# Altium footprint library Connectors.PcbLib: 68 footprints (part 1 of 5)
Each footprint in its own frame and in the unit in brackets; x right, y up, seen from the top. Pads: shape width x height; smd on the part's side, far side on the other; paste and mask are expansions set on the pad; w line width, h text height; cw(c..) or ccw(c..) is an arc to the next point about the centre after c.
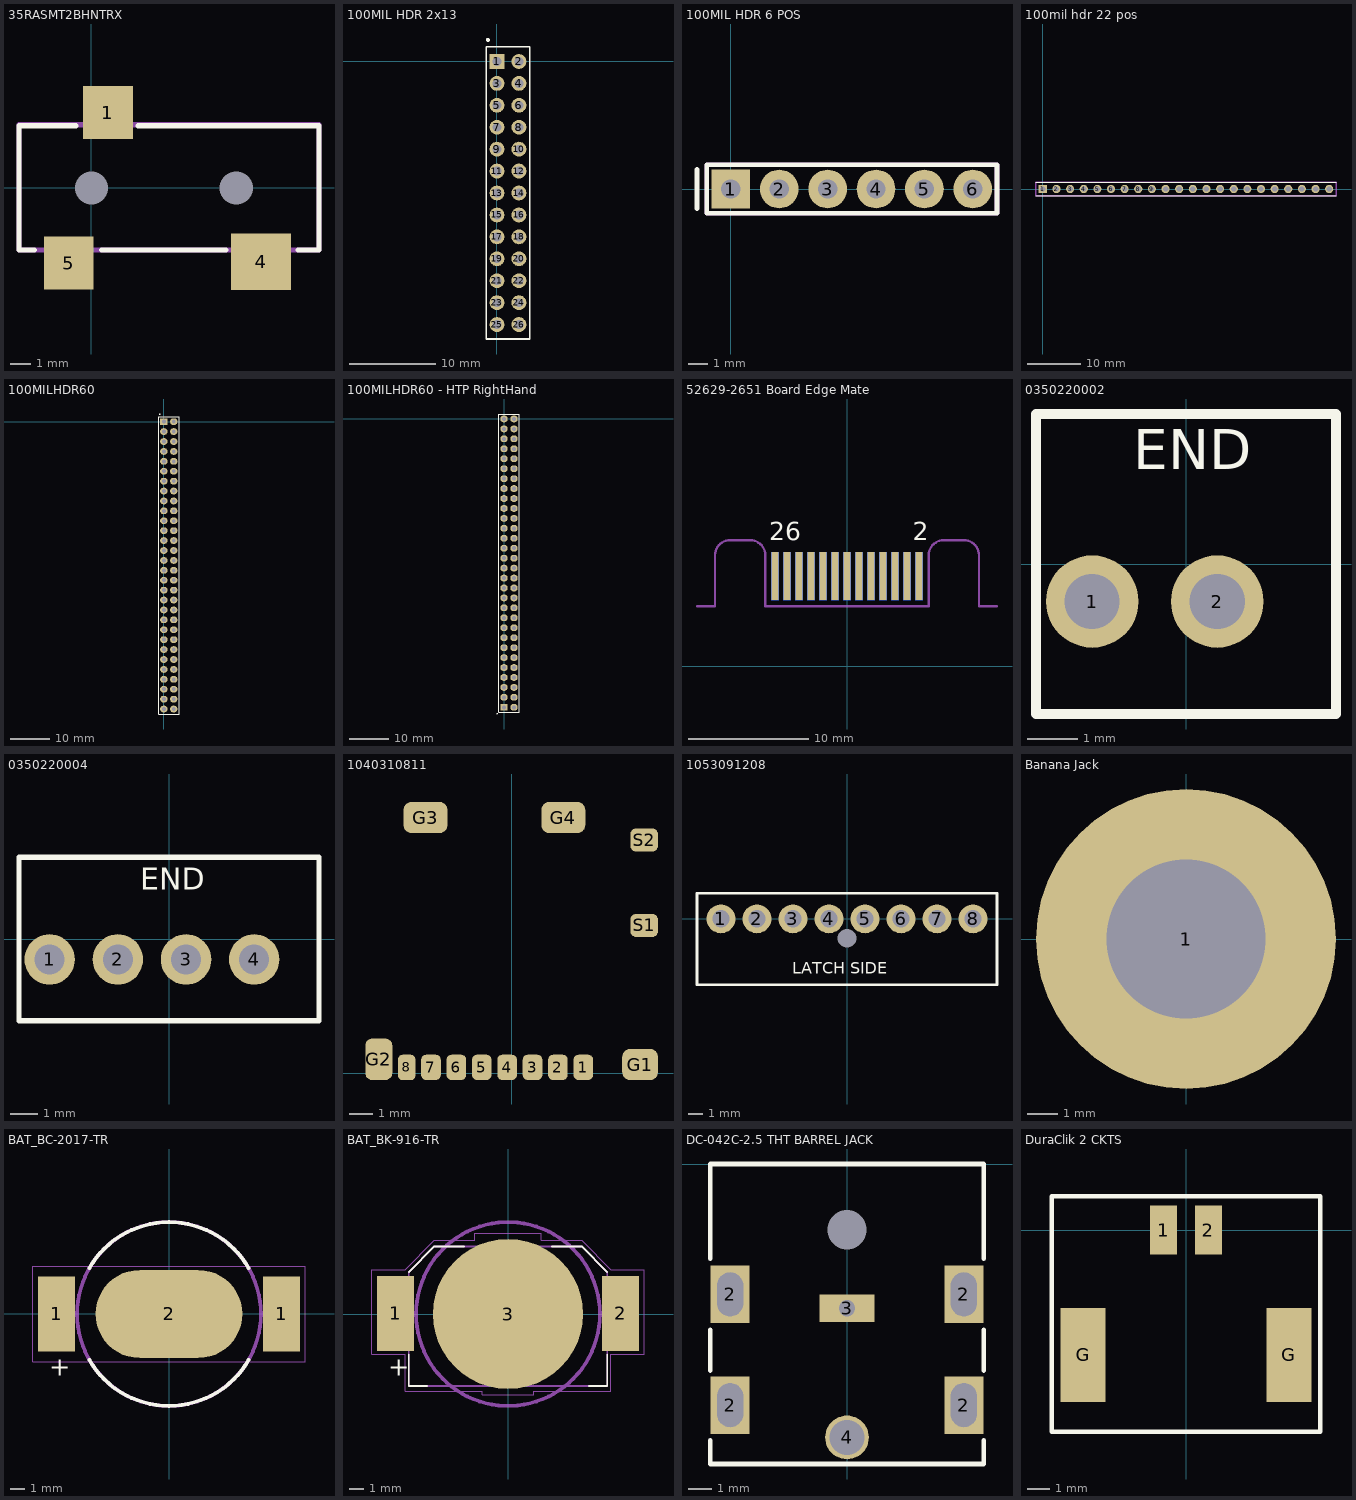
[diagram p0: the footprints below, top view; thin cyan lines are the x and y axes]

## 35RASMT2BHNTRX [mm]
pads (5):
  rect 2.4x2.55 smd: 1(0.8,3.638) 5(-1.1,-3.638)
  rect 2.9x2.75 smd: 4(8.2,-3.575)
  round 0 hole 1.6 unplated: M(0,0) M(7,0)
Top Overlay:
  lines w0.254: -2.75,-3 -3.5,-3 -3.5,3 -1,3 -0.75,3 ; 0.5,-3 6.5,-3 ; 2.25,3 11,3 11,-3 10,-3
Top Assy Drawing:
  lines w0.254: -3.5,-3 11,-3 11,3.048 -3.5,3.048 -3.5,-3
  text ".Designator" at -2.54,-1.27 h1.27
3D body "35RASMT2BHNTRX-TRS Connector v3.step": height 5.02, standoff -0.98, extent -5.982,-4.496 11.011,4.496

## 100MIL HDR 2x13 [mm]
pads (26):
  rect 1.72x1.72 hole 1.02: 1(0,0)
  round 1.72 hole 1.02: 2(2.54,0) 3(0,-2.54) 4(2.54,-2.54) 5(0,-5.08) 6(2.54,-5.08) 7(0,-7.62) 8(2.54,-7.62) 9(0,-10.16) 10(2.54,-10.16) 11(0,-12.7) 12(2.54,-12.7) 13(0,-15.24) 14(2.54,-15.24) 15(0,-17.78) 16(2.54,-17.78) 17(0,-20.32) 18(2.54,-20.32) 19(0,-22.86) 20(2.54,-22.86) 21(0,-25.4) 22(2.54,-25.4) 23(0,-27.94) 24(2.54,-27.94) 25(0,-30.48) 26(2.54,-30.48)
Top Overlay:
  circle w0.254: c-1.05,2.5 r0.1
  lines w0.2: -1.25,-32.15 3.8,-32.15 3.8,0 3.8,1.7 -1.25,1.7 -1.25,0.25 -1.25,-32.15

## 100MIL HDR 6 POS [mil]
pads (6):
  rect 80x80 hole 40: 1(0,0)
  round 80 hole 40: 2(100,0) 3(200,0) 4(300,0) 5(400,0) 6(500,0)
Top Overlay:
  lines w10: -70,-40 -70,40 ; -50,-50 -50,50 550,50 550,-50 -50,-50
Top Assy Drawing:
  lines w10: -50,-50 -50,50 550,50 550,-50 -50,-50
3D body "c-3-644456-6-j-3d.stp": height 395, standoff -110, extent -44.09,-45.99 544.1,46.01

## 100mil hdr 22 pos [mil]
pads (22):
  rect 60x60 hole 40: 1(0,0)
  round 60 hole 40: 2(100,0) 3(200,0) 4(300,0) 5(400,0) 6(500,0) 7(600,0) 8(700,0) 9(800,0) 10(900,0) 11(1000,0) 12(1100,0) 13(1200,0) 14(1300,0) 15(1400,0) 16(1500,0) 17(1600,0) 18(1700,0) 19(1800,0) 20(1900,0) 21(2000,0) 22(2100,0)
Top Overlay:
  lines w7.87: -50,-50 2150,-50 ; -50,50 2150,50
Top Assy Drawing:
  lines w10: -50,-50 -50,50 2150,50 2150,-50 -50,-50
  text ".Designator" at 740,-60 h50
3D body "022284220.stp": height 330, standoff -125, extent -49.99,-45 2150.01,53

## 100MILHDR60 [mm]
pads (60):
  rect 1.9x1.72 hole 1.02: 1(0,0)
  oval 1.9x1.72 hole 1.02: 2(2.54,0) 3(0,-2.54) 4(2.54,-2.54) 5(0,-5.08) 6(2.54,-5.08) 7(0,-7.62) 8(2.54,-7.62) 9(0,-10.16) 10(2.54,-10.16) 11(0,-12.7) 12(2.54,-12.7) 13(0,-15.24) 14(2.54,-15.24) 15(0,-17.78) 16(2.54,-17.78) 17(0,-20.32) 18(2.54,-20.32) 19(0,-22.86) 20(2.54,-22.86) 21(0,-25.4) 22(2.54,-25.4) 23(0,-27.94) 24(2.54,-27.94) 25(0,-30.48) 26(2.54,-30.48) 27(0,-33.02) 28(2.54,-33.02) 29(0,-35.56) 30(2.54,-35.56) 31(0,-38.1) 32(2.54,-38.1) 33(0,-40.64) 34(2.54,-40.64) 35(0,-43.18) 36(2.54,-43.18) 37(0,-45.72) 38(2.54,-45.72) 39(0,-48.26) 40(2.54,-48.26) 41(0,-50.8) 42(2.54,-50.8) 43(0,-53.34) 44(2.54,-53.34) 45(0,-55.88) 46(2.54,-55.88) 47(0,-58.42) 48(2.54,-58.42) 49(0,-60.96) 50(2.54,-60.96) 51(0,-63.5) 52(2.54,-63.5) 53(0,-66.04) 54(2.54,-66.04) 55(0,-68.58) 56(2.54,-68.58) 57(0,-71.12) 58(2.54,-71.12) 59(0,-73.66) 60(2.54,-73.66)
Top Overlay:
  circle w0.254: c-1.05,1.9 r0.071
  lines w0.2: -1.3,-74.93 3.95,-74.93 3.95,1.27 -1.3,1.27 -1.3,-74.93

## 100MILHDR60 - HTP RightHand [mm] "60-pin connector for mounting on right hand side of HTP. Mates correctly with OBC (top connector). Assume right-angle connector style."
pads (60):
  rect 1.72x1.72 hole 1.02: 1(0,-73.66)
  oval 1.9x1.72 hole 1.02: 2(2.54,-73.66) 3(0,-71.12) 4(2.54,-71.12) 5(0,-68.58) 6(2.54,-68.58) 7(0,-66.04) 8(2.54,-66.04) 9(0,-63.5) 10(2.54,-63.5) 11(0,-60.96) 12(2.54,-60.96) 13(0,-58.42) 14(2.54,-58.42) 15(0,-55.88) 16(2.54,-55.88) 17(0,-53.34) 18(2.54,-53.34) 19(0,-50.8) 20(2.54,-50.8) 21(0,-48.26) 22(2.54,-48.26) 23(0,-45.72) 24(2.54,-45.72) 25(0,-43.18) 26(2.54,-43.18) 27(0,-40.64) 28(2.54,-40.64) 29(0,-38.1) 30(2.54,-38.1) 31(0,-35.56) 32(2.54,-35.56) 33(0,-33.02) 34(2.54,-33.02) 35(0,-30.48) 36(2.54,-30.48) 37(0,-27.94) 38(2.54,-27.94) 39(0,-25.4) 40(2.54,-25.4) 41(0,-22.86) 42(2.54,-22.86) 43(0,-20.32) 44(2.54,-20.32) 45(0,-17.78) 46(2.54,-17.78) 47(0,-15.24) 48(2.54,-15.24) 49(0,-12.7) 50(2.54,-12.7) 51(0,-10.16) 52(2.54,-10.16) 53(0,-7.62) 54(2.54,-7.62) 55(0,-5.08) 56(2.54,-5.08) 57(0,-2.54) 58(2.54,-2.54) 59(0,0) 60(2.54,0)
Top Overlay:
  circle w0.254: c-1.75,-75.3 r0.071
  lines w0.2: -1.35,-74.93 -1.35,1.27 3.85,1.27 3.85,-74.93 -1.35,-74.93

## 52629-2651 Board Edge Mate [mm] "Board Edge Mate for Molex 52629-2651"
pads (26):
  rect 0.6x4 smd far side: 1(6,7.5) 3(5,7.5) 5(4,7.5) 7(3,7.5) 9(2,7.5) 11(1,7.5) 13(0,7.5) 15(-1,7.5) 17(-2,7.5) 19(-3,7.5) 21(-4,7.5) 23(-5,7.5) 25(-6,7.5)
  rect 0.6x4 smd: 2(6,7.5) 4(5,7.5) 6(4,7.5) 8(3,7.5) 10(2,7.5) 12(1,7.5) 14(0,7.5) 16(-1,7.5) 18(-2,7.5) 20(-3,7.5) 22(-4,7.5) 24(-5,7.5) 26(-6,7.5)
Top Overlay:
  text "26" at -6.5,10.5 h1.52
  text "2" at 5.5,10.5 h1.52
Bottom Overlay:
  text "25" at -4,10.5 h1.52
  text "1" at 6,10.5 h1.52
Top Dimensions and Assy Info:
  lines w0.2: -12.5,5 -11,5 -11,8.5 -11,9.23 cw(c-9.73,9.23) -9.73,10.5 -8.73,10.5 -8.07,10.5 cw(c-8.07,9.23) -6.8,9.23 -6.8,9 -6.8,5 -6.3,5 6.3,5 6.4,5 6.8,5 6.8,9 6.8,9.23 cw(c8.07,9.23) 8.07,10.5 9.5,10.5 9.73,10.5 cw(c9.73,9.23) 11,9.23 11,8 11,5 12.5,5
  text "Board thickness must be 1.0 mm" at -14.5,13.5 h1
3D body "526292651.stp": height 2.5, standoff -3.65, extent -15,-2.85 15,10.15

## 0350220002 [mm] "CONN PLUG 4POS 2.5MM R/A"
height 3
pads (2):
  round 1.85 hole 1.1: 1(-1.875,-0.75) 2(0.625,-0.75)
Top Overlay:
  lines w0.2: -3,-3 -3,3 3,3 3,-3 -3,-3
  text "END" at -1.05,1.9 h0.8
3D body "350220002.stp": height 2.98, standoff 0.02, extent -3,-2.95 3,2.95

## 0350220004 [mm] "CONN PLUG 4POS 2.5MM R/A"
height 3
pads (4):
  round 1.85 hole 1.1: 1(-4.375,-0.75) 2(-1.875,-0.75) 3(0.625,-0.75) 4(3.125,-0.75)
Top Overlay:
  lines w0.2: -5.5,-3 -5.5,3 5.5,3 5.5,-3 -5.5,-3
  text "END" at -1.05,1.8 h0.8
3D body "350220004.stp": height 2.98, standoff 0.02, extent -5.5,-2.95 5.5,2.95

## 1040310811 [mm] "CONN MICRO SD CARD PUSH-PULL R/A"
height 1.5
pads (14):
  rrect50% 0.85x1.1 smd: 1(3.105,0.25) 2(2.005,0.25) 3(0.905,0.25) 4(-0.195,0.25) 5(-1.295,0.25) 6(-2.395,0.25) 7(-3.495,0.25)
  rrect50% 0.75x1.1 smd: 8(-4.545,0.25)
  rrect50% 1.55x1.35 smd: G1(5.565,0.375)
  rrect50% 1.17x1.8 smd: G2(-5.755,0.6)
  rrect50% 1.9x1.35 smd: G3(-3.73,11.075) G4(2.24,11.075)
  rrect50% 1.2x1 smd: S1(5.74,6.4) S2(5.74,10.1)
3D body "1040310811 Micro SD Slot v8.step": height 1.46, standoff 0.01, extent -5.95,0.1 6,11.5

## 1053091208 [mm] "NANO-FIT HDR VT SGL KNK 8CKT 15A"
height 10.51
pads (9):
  round 2 hole 1.2: 1(-8.75,0) 2(-6.25,0) 3(-3.75,0) 4(-1.25,0) 5(1.25,0) 6(3.75,0) 7(6.25,0) 8(8.75,0)
  round 0 hole 1.3: 9(0,-1.34)
Top Overlay:
  lines w0.2: -10.414,-4.572 -10.414,-1.27 -10.414,1.778 10.414,1.778 10.414,-1.27 10.414,-4.572 -10.414,-4.572
  text "LATCH SIDE" at -3.81,-3.81 h0.8
3D body "1053091208.stp": height 10.68, standoff -3.03, extent -10.47,-4.6 10.47,1.74

## Banana Jack [mm] "JACK NON-INSULATED .350\""
height 2.36
pads (1):
  round 10 hole 5.3: 1(0,0)
3D body "Keystone-PN575-4 Banana Swage v4.step": height 2.37, standoff -5.52, extent -3.962,-3.959 3.962,3.959

## BAT_BC-2017-TR [mm]
pads (3):
  rect 2.5x5.1 smd: 1(-7.65,0) 1(7.65,0)
  oval 10x6 smd: 2(0,0)
Top Overlay:
  lines w0.254: -5.413,-3.125 ccw(c0,0) 5.412,-3.125 ; -5.413,3.125 cw(c0,0) 5.413,3.125
  text "+" at -8.128,-4.191 h1.27
Top Dimensions and Assy Info:
  circle w0.254: c0,0 r6.25
Top Courtyard:
  lines w0.05: -9.25,-3.24 -9.25,3.24 6.76,3.24 9.25,3.24 9.25,-3.24 6.51,-3.24 -9.25,-3.24
3D body "User Library-CR1216.STEP": height 1.6, standoff 0, extent -6.2,-6.2 6.2,6.2
3D body "BC-2017.STEP": height 2.11, standoff 0, extent -8.7,-3.24 8.7,3.24

## BAT_BK-916-TR [mm]
pads (3):
  rect 2.5x5.1 smd: 1(-7.65,0.05) 2(7.65,0.05)
  round 10.2 smd: 3(0,0)
Top Overlay:
  lines w0.127: -6.75,-2.75 -6.75,-4.9 -5.5,-4.9 ; -6.75,2.85 -5,4.6 -3,4.6 ; 3,4.6 5,4.6 6.75,2.85 ; 5.5,-4.9 6.75,-4.9 6.75,-2.75
  text "+" at -8.128,-4.191 h1.27
Top Dimensions and Assy Info:
  circle w0.254: c0,0 r6.25
3D Bodies:
  lines w0.127: -6.75,-4.9 -6.75,2.85 -5,4.6 5,4.6 6.75,2.85 6.75,-4.9 -6.75,-4.9
Component Info:
  lines w0.05: -9.25,-2.75 -7,-2.75 -7,-5.25 -1.75,-5.25 -1.75,-5.5 1.75,-5.5 1.75,-5.25 7,-5.25 7,-2.75 9.25,-2.75 9.25,3 7,3 5,5 2.25,5 2.25,5.5 -2.25,5.5 -2.25,5 -5,5 -7,3 -9.25,3 -9.25,-2.75
3D body "BK-916-TR.step": height 3.61, standoff 0.01, extent -7.65,-4.964 7.65,4.813

## DC-042C-2.5 THT BARREL JACK [mm] "CONN PWR JACK 2.5mm SOLDER"
height 11
pads (7):
  rect 1.7x2.5 hole 1.13 slot 1.9 at 90 deg: 2(-5.065,-10.45) 2(-5.065,-5.65) 2(5.065,-10.45) 2(5.065,-5.65)
  rect 2.4x1.2 hole 0.7 square: 3(0,-6.25)
  round 1.9 hole 1.5: 4(0,-11.85)
  round 0 hole 1.7 unplated: G(0,-2.85)
Top Overlay:
  lines w0.2: -5.925,-11.975 -5.925,-13 5.925,-13 5.925,-11.975 ; -5.925,-8.95 -5.925,-7.175 ; -5.925,-4.1 -5.925,0 5.925,0 5.925,-4.1 ; 5.925,-8.95 5.925,-7.175
3D body "DC-042C-2.5 DC Barrel Jack v19.step": height 10, standoff -2.2, extent -5.2,-13 5.2,0

## DuraClik 2 CKTS [mm] "5600200420"
height 9.3
pads (4):
  rect 1.2x2.2 smd: 1(-1,0) 2(1,0)
  rect 2x4.2 smd: G(-4.6,-5.58) G(4.6,-5.58)
Top Overlay:
  lines w0.2: -6,-9 -6,1.5 6,1.5 6,-9 -6,-9
3D body "5600200220.stp": height 8, standoff 0, extent -5.45,-8.55 5.45,0.6